# Altium footprint library Resistors_SMD_IPC-SM-782.PcbLib: 200 footprints (part 2 of 13)
Each footprint in its own frame and in the unit in brackets; x right, y up, seen from the top. Pads: shape width x height; smd on the part's side, far side on the other; paste and mask are expansions set on the pad; w line width, h text height; cw(c..) or ccw(c..) is an arc to the next point about the centre after c.
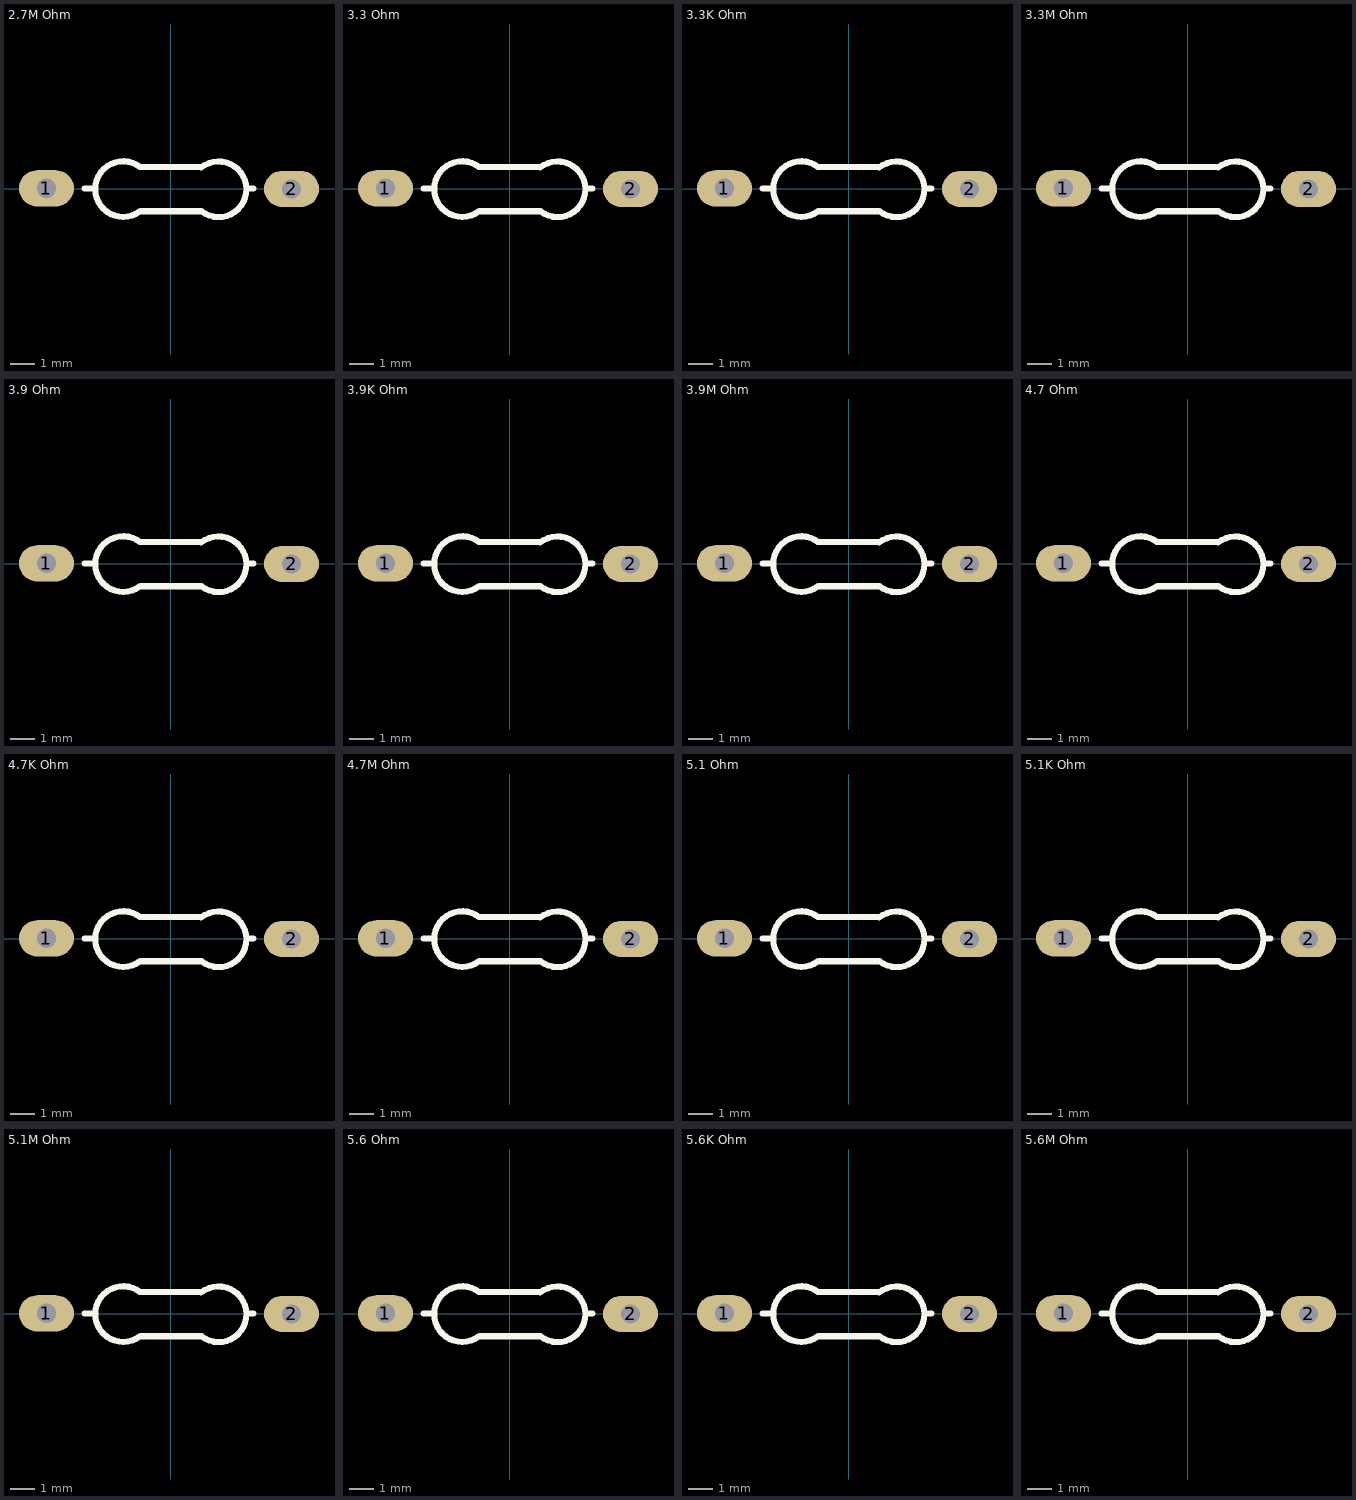
[diagram p1: the footprints below, top view; thin cyan lines are the x and y axes]

## 2.7M Ohm [mm] "RESISTENCIA DE 1/4 W DE 2.7M OHM"
pads (2):
  oval 2.27x1.5 hole 0.8: 1(-5.125,0.025) 2(5,0)
Top Overlay:
  lines w0.254: -3.55,0.025 -3.225,0.025 ; -1.269,-0.925 cw(c-1.959,-0.005) -1.25,0.9 ; -1.248,0.9 1.25,0.9 ; -1.245,-0.925 1.286,-0.925 ; 1.265,0.881 cw(c1.985,-0.015) 1.286,-0.928 ; 3.15,0.025 3.425,0.025
3D body "SW3dPS-RESISTOR, 0.25 W, 0.4 IN LEAD PITCH.STEP": height 1.16, standoff -1.16, extent -5.56,-2.349 5.21,3.125
3D body "Res 2M7.STEP": height 2.93, standoff -0.91, extent -5.385,-1.168 5.385,1.143

## 3.3 Ohm [mm] "RESISTENCIA DE 1/4 W DE 3.3 OHM"
pads (2):
  oval 2.27x1.5 hole 0.8: 1(-5.125,0.025) 2(5,0)
Top Overlay:
  lines w0.254: -3.55,0.025 -3.225,0.025 ; -1.269,-0.925 cw(c-1.959,-0.005) -1.25,0.9 ; -1.248,0.9 1.25,0.9 ; -1.245,-0.925 1.286,-0.925 ; 1.265,0.881 cw(c1.985,-0.015) 1.286,-0.928 ; 3.15,0.025 3.425,0.025
3D body "SW3dPS-RESISTOR, 0.25 W, 0.4 IN LEAD PITCH.STEP": height 1.16, standoff -1.16, extent -5.56,-2.349 5.21,3.125
3D body "Res 3.3.STEP": height 2.93, standoff -0.91, extent -5.385,-1.168 5.385,1.143

## 3.3K Ohm [mm] "RESISTENCIA DE 1/4 W DE 3.3K OHM"
pads (2):
  oval 2.27x1.5 hole 0.8: 1(-5.125,0.025) 2(5,0)
Top Overlay:
  lines w0.254: -3.55,0.025 -3.225,0.025 ; -1.269,-0.925 cw(c-1.959,-0.005) -1.25,0.9 ; -1.248,0.9 1.25,0.9 ; -1.245,-0.925 1.286,-0.925 ; 1.265,0.881 cw(c1.985,-0.015) 1.286,-0.928 ; 3.15,0.025 3.425,0.025
3D body "SW3dPS-RESISTOR, 0.25 W, 0.4 IN LEAD PITCH.STEP": height 1.16, standoff -1.16, extent -5.56,-2.349 5.21,3.125
3D body "Res 3K3.STEP": height 2.93, standoff -0.91, extent -5.385,-1.168 5.385,1.143

## 3.3M Ohm [mm] "RESISTENCIA DE 1/4 W DE 3.3M OHM"
pads (2):
  oval 2.27x1.5 hole 0.8: 1(-5.125,0.025) 2(5,0)
Top Overlay:
  lines w0.254: -3.55,0.025 -3.225,0.025 ; -1.269,-0.925 cw(c-1.959,-0.005) -1.25,0.9 ; -1.248,0.9 1.25,0.9 ; -1.245,-0.925 1.286,-0.925 ; 1.265,0.881 cw(c1.985,-0.015) 1.286,-0.928 ; 3.15,0.025 3.425,0.025
3D body "Res 3M3.STEP": height 2.93, standoff -0.91, extent -5.385,-1.168 5.385,1.143
3D body "SW3dPS-RESISTOR, 0.25 W, 0.4 IN LEAD PITCH.STEP": height 1.16, standoff -1.16, extent -5.56,-2.349 5.21,3.125

## 3.9 Ohm [mm] "RESISTENCIA DE 1/4 W DE 3.9 OHM"
pads (2):
  oval 2.27x1.5 hole 0.8: 1(-5.125,0.025) 2(5,0)
Top Overlay:
  lines w0.254: -3.55,0.025 -3.225,0.025 ; -1.269,-0.925 cw(c-1.959,-0.005) -1.25,0.9 ; -1.248,0.9 1.25,0.9 ; -1.245,-0.925 1.286,-0.925 ; 1.265,0.881 cw(c1.985,-0.015) 1.286,-0.928 ; 3.15,0.025 3.425,0.025
3D body "Res 3.9.STEP": height 2.93, standoff -0.91, extent -5.385,-1.168 5.385,1.143
3D body "SW3dPS-RESISTOR, 0.25 W, 0.4 IN LEAD PITCH.STEP": height 1.16, standoff -1.16, extent -5.56,-2.349 5.21,3.125

## 3.9K Ohm [mm] "RESISTENCIA DE 1/4 W DE 3.9K OHM"
pads (2):
  oval 2.27x1.5 hole 0.8: 1(-5.125,0.025) 2(5,0)
Top Overlay:
  lines w0.254: -3.55,0.025 -3.225,0.025 ; -1.269,-0.925 cw(c-1.959,-0.005) -1.25,0.9 ; -1.248,0.9 1.25,0.9 ; -1.245,-0.925 1.286,-0.925 ; 1.265,0.881 cw(c1.985,-0.015) 1.286,-0.928 ; 3.15,0.025 3.425,0.025
3D body "Res 3K9.STEP": height 2.93, standoff -0.91, extent -5.385,-1.168 5.385,1.143
3D body "SW3dPS-RESISTOR, 0.25 W, 0.4 IN LEAD PITCH.STEP": height 1.16, standoff -1.16, extent -5.56,-2.349 5.21,3.125

## 3.9M Ohm [mm] "RESISTENCIA DE 1/4 W DE 3.9M OHM"
pads (2):
  oval 2.27x1.5 hole 0.8: 1(-5.125,0.025) 2(5,0)
Top Overlay:
  lines w0.254: -3.55,0.025 -3.225,0.025 ; -1.269,-0.925 cw(c-1.959,-0.005) -1.25,0.9 ; -1.248,0.9 1.25,0.9 ; -1.245,-0.925 1.286,-0.925 ; 1.265,0.881 cw(c1.985,-0.015) 1.286,-0.928 ; 3.15,0.025 3.425,0.025
3D body "SW3dPS-RESISTOR, 0.25 W, 0.4 IN LEAD PITCH.STEP": height 1.16, standoff -1.16, extent -5.56,-2.349 5.21,3.125
3D body "Res 3M3.STEP": height 2.93, standoff -0.91, extent -5.385,-1.168 5.385,1.143

## 4.7 Ohm [mm] "RESISTENCIA DE 1/4 W DE 4.7 OHM"
pads (2):
  oval 2.27x1.5 hole 0.8: 1(-5.125,0.025) 2(5,0)
Top Overlay:
  lines w0.254: -3.55,0.025 -3.225,0.025 ; -1.269,-0.925 cw(c-1.959,-0.005) -1.25,0.9 ; -1.248,0.9 1.25,0.9 ; -1.245,-0.925 1.286,-0.925 ; 1.265,0.881 cw(c1.985,-0.015) 1.286,-0.928 ; 3.15,0.025 3.425,0.025
3D body "Res 4.7.STEP": height 2.93, standoff -0.91, extent -5.385,-1.168 5.385,1.143
3D body "SW3dPS-RESISTOR, 0.25 W, 0.4 IN LEAD PITCH.STEP": height 1.16, standoff -1.16, extent -5.56,-2.349 5.21,3.125

## 4.7K Ohm [mm] "RESISTENCIA DE 1/4 W DE 4.7K OHM"
pads (2):
  oval 2.27x1.5 hole 0.8: 1(-5.125,0.025) 2(5,0)
Top Overlay:
  lines w0.254: -3.55,0.025 -3.225,0.025 ; -1.269,-0.925 cw(c-1.959,-0.005) -1.25,0.9 ; -1.248,0.9 1.25,0.9 ; -1.245,-0.925 1.286,-0.925 ; 1.265,0.881 cw(c1.985,-0.015) 1.286,-0.928 ; 3.15,0.025 3.425,0.025
3D body "Res 4K7.STEP": height 2.93, standoff -0.91, extent -5.385,-1.168 5.385,1.143
3D body "SW3dPS-RESISTOR, 0.25 W, 0.4 IN LEAD PITCH.STEP": height 1.16, standoff -1.16, extent -5.56,-2.349 5.21,3.125

## 4.7M Ohm [mm] "RESISTENCIA DE 1/4 W DE 4.7M OHM"
pads (2):
  oval 2.27x1.5 hole 0.8: 1(-5.125,0.025) 2(5,0)
Top Overlay:
  lines w0.254: -3.55,0.025 -3.225,0.025 ; -1.269,-0.925 cw(c-1.959,-0.005) -1.25,0.9 ; -1.248,0.9 1.25,0.9 ; -1.245,-0.925 1.286,-0.925 ; 1.265,0.881 cw(c1.985,-0.015) 1.286,-0.928 ; 3.15,0.025 3.425,0.025
3D body "SW3dPS-RESISTOR, 0.25 W, 0.4 IN LEAD PITCH.STEP": height 1.16, standoff -1.16, extent -5.56,-2.349 5.21,3.125
3D body "Res 4M7.STEP": height 2.93, standoff -0.91, extent -5.385,-1.168 5.385,1.143

## 5.1 Ohm [mm] "RESISTENCIA DE 1/4 W DE 5.1 OHM"
pads (2):
  oval 2.27x1.5 hole 0.8: 1(-5.125,0.025) 2(5,0)
Top Overlay:
  lines w0.254: -3.55,0.025 -3.225,0.025 ; -1.269,-0.925 cw(c-1.959,-0.005) -1.25,0.9 ; -1.248,0.9 1.25,0.9 ; -1.245,-0.925 1.286,-0.925 ; 1.265,0.881 cw(c1.985,-0.015) 1.286,-0.928 ; 3.15,0.025 3.425,0.025
3D body "SW3dPS-RESISTOR, 0.25 W, 0.4 IN LEAD PITCH.STEP": height 1.16, standoff -1.16, extent -5.56,-2.349 5.21,3.125
3D body "Res 5.1.STEP": height 2.93, standoff -0.91, extent -5.385,-1.168 5.385,1.143

## 5.1K Ohm [mm] "RESISTENCIA DE 1/4 W DE 5.1K OHM"
pads (2):
  oval 2.27x1.5 hole 0.8: 1(-5.125,0.025) 2(5,0)
Top Overlay:
  lines w0.254: -3.55,0.025 -3.225,0.025 ; -1.269,-0.925 cw(c-1.959,-0.005) -1.25,0.9 ; -1.248,0.9 1.25,0.9 ; -1.245,-0.925 1.286,-0.925 ; 1.265,0.881 cw(c1.985,-0.015) 1.286,-0.928 ; 3.15,0.025 3.425,0.025
3D body "Res 5K1.STEP": height 2.93, standoff -0.91, extent -5.385,-1.168 5.385,1.143
3D body "SW3dPS-RESISTOR, 0.25 W, 0.4 IN LEAD PITCH.STEP": height 1.16, standoff -1.16, extent -5.56,-2.349 5.21,3.125

## 5.1M Ohm [mm] "RESISTENCIA DE 1/4 W DE 5.1M OHM"
pads (2):
  oval 2.27x1.5 hole 0.8: 1(-5.125,0.025) 2(5,0)
Top Overlay:
  lines w0.254: -3.55,0.025 -3.225,0.025 ; -1.269,-0.925 cw(c-1.959,-0.005) -1.25,0.9 ; -1.248,0.9 1.25,0.9 ; -1.245,-0.925 1.286,-0.925 ; 1.265,0.881 cw(c1.985,-0.015) 1.286,-0.928 ; 3.15,0.025 3.425,0.025
3D body "Res 5M1.STEP": height 2.93, standoff -0.91, extent -5.385,-1.168 5.385,1.143
3D body "SW3dPS-RESISTOR, 0.25 W, 0.4 IN LEAD PITCH.STEP": height 1.16, standoff -1.16, extent -5.56,-2.349 5.21,3.125

## 5.6 Ohm [mm] "RESISTENCIA DE 1/4 W DE 5.6 OHM"
pads (2):
  oval 2.27x1.5 hole 0.8: 1(-5.125,0.025) 2(5,0)
Top Overlay:
  lines w0.254: -3.55,0.025 -3.225,0.025 ; -1.269,-0.925 cw(c-1.959,-0.005) -1.25,0.9 ; -1.248,0.9 1.25,0.9 ; -1.245,-0.925 1.286,-0.925 ; 1.265,0.881 cw(c1.985,-0.015) 1.286,-0.928 ; 3.15,0.025 3.425,0.025
3D body "SW3dPS-RESISTOR, 0.25 W, 0.4 IN LEAD PITCH.STEP": height 1.16, standoff -1.16, extent -5.56,-2.349 5.21,3.125
3D body "Res 5.6.STEP": height 2.93, standoff -0.91, extent -5.385,-1.168 5.385,1.143

## 5.6K Ohm [mm] "RESISTENCIA DE 1/4 W DE 5.6K OHM"
pads (2):
  oval 2.27x1.5 hole 0.8: 1(-5.125,0.025) 2(5,0)
Top Overlay:
  lines w0.254: -3.55,0.025 -3.225,0.025 ; -1.269,-0.925 cw(c-1.959,-0.005) -1.25,0.9 ; -1.248,0.9 1.25,0.9 ; -1.245,-0.925 1.286,-0.925 ; 1.265,0.881 cw(c1.985,-0.015) 1.286,-0.928 ; 3.15,0.025 3.425,0.025
3D body "SW3dPS-RESISTOR, 0.25 W, 0.4 IN LEAD PITCH.STEP": height 1.16, standoff -1.16, extent -5.56,-2.349 5.21,3.125
3D body "Res 5K6.STEP": height 2.93, standoff -0.91, extent -5.385,-1.168 5.385,1.143

## 5.6M Ohm [mm] "RESISTENCIA DE 1/4 W DE 5.6M OHM"
pads (2):
  oval 2.27x1.5 hole 0.8: 1(-5.125,0.025) 2(5,0)
Top Overlay:
  lines w0.254: -3.55,0.025 -3.225,0.025 ; -1.269,-0.925 cw(c-1.959,-0.005) -1.25,0.9 ; -1.248,0.9 1.25,0.9 ; -1.245,-0.925 1.286,-0.925 ; 1.265,0.881 cw(c1.985,-0.015) 1.286,-0.928 ; 3.15,0.025 3.425,0.025
3D body "SW3dPS-RESISTOR, 0.25 W, 0.4 IN LEAD PITCH.STEP": height 1.16, standoff -1.16, extent -5.56,-2.349 5.21,3.125
3D body "Res 5M6.STEP": height 2.93, standoff -0.91, extent -5.385,-1.168 5.385,1.143